# Altium footprint library SparkFun.PCBLIB: 674 footprints (part 22 of 44)
Each footprint in its own frame and in the unit in brackets; x right, y up, seen from the top. Pads: shape width x height; smd on the part's side, far side on the other; paste and mask are expansions set on the pad; w line width, h text height; cw(c..) or ccw(c..) is an arc to the next point about the centre after c.
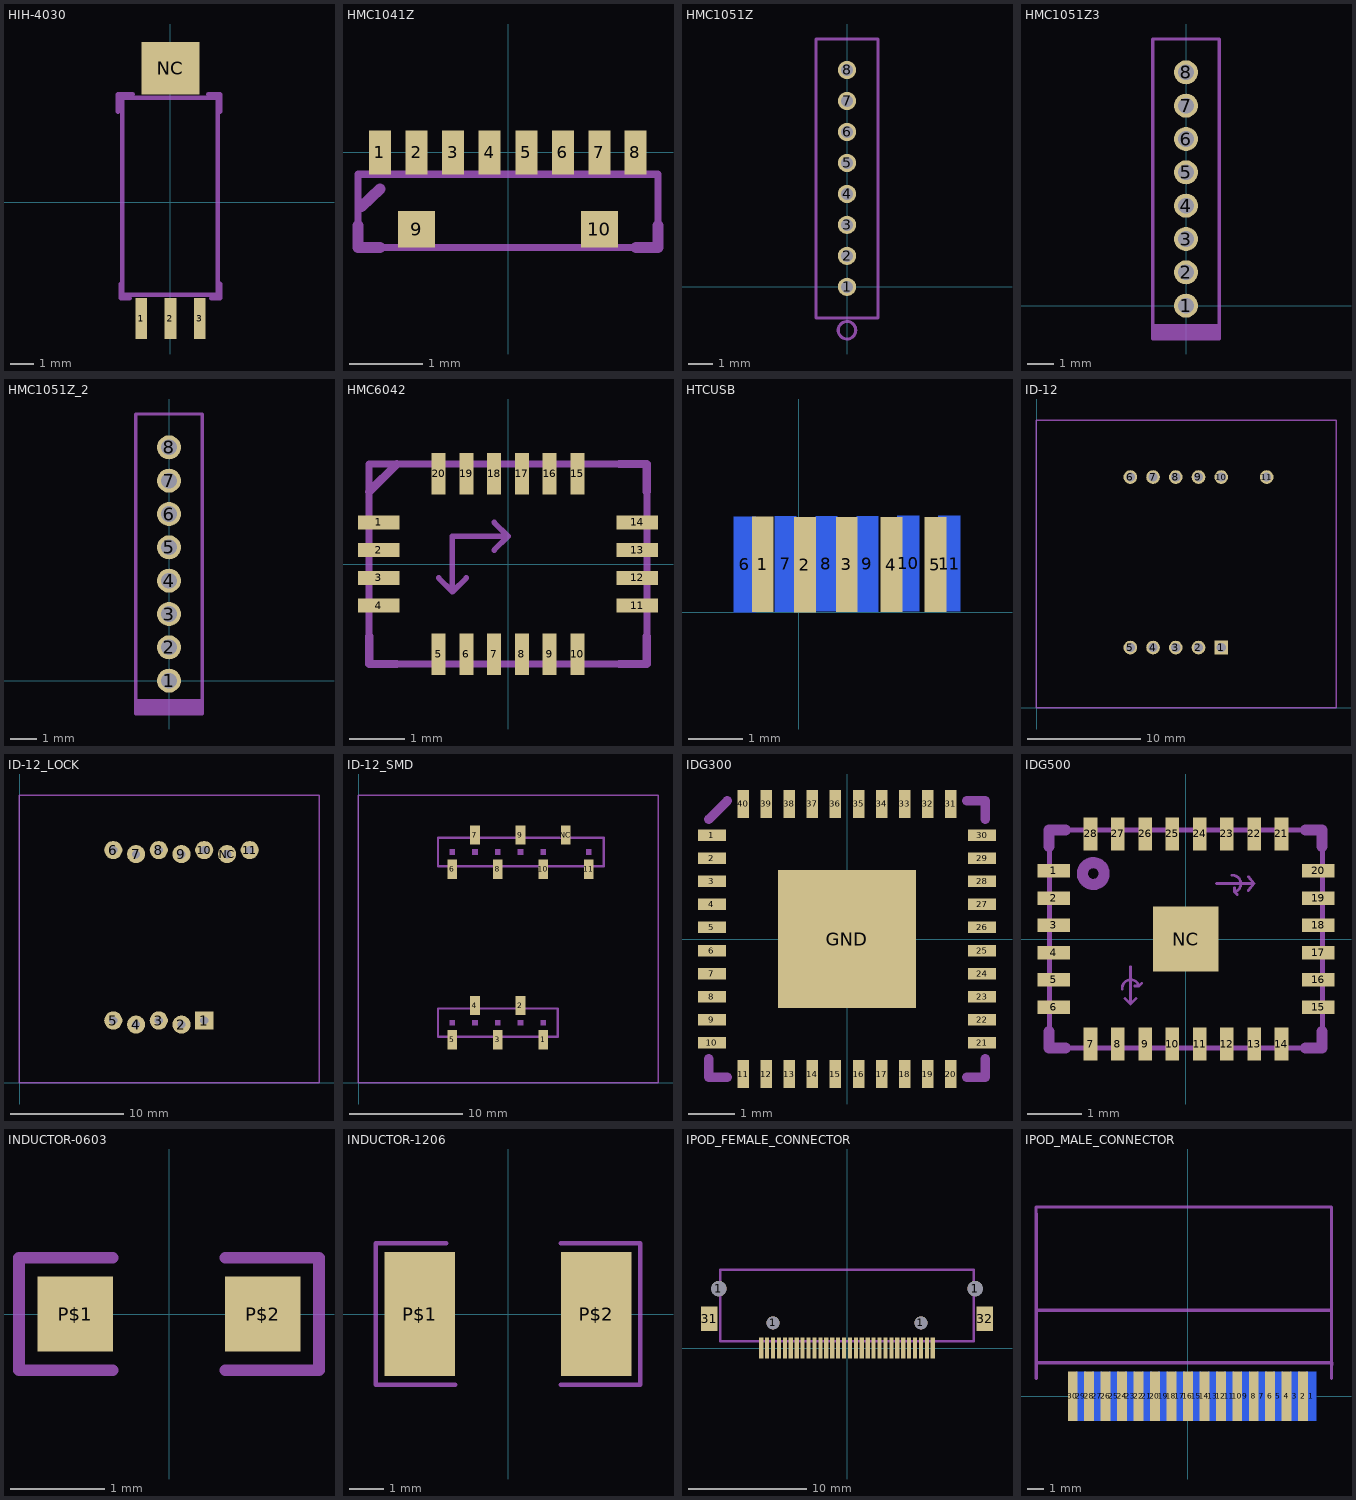
[diagram p21: the footprints below, top view; thin cyan lines are the x and y axes]

## HIH-4030 [mil]
pads (4):
  rect 20x70 smd: 1(-50,-200) 2(0,-200) 3(50,-200)
  rect 100x90 smd: NC(0,230)
Mechanical 2:
  lines w8: -90,155 -90,185 -65,185 ; -85,-140 -85,-165 -70,-165 ; 65,185 85,185 85,155 ; 70,-165 85,-165 85,-140
Mechanical 18:
  lines w8: -83,-159 81,-159 81,179 -83,179 -83,-159

## HMC1041Z [mil]
pads (10):
  rect 11.81x23.62 smd: 1(-68.9,0) 2(-49.21,0) 3(-29.53,0) 4(-9.84,0) 5(9.84,0) 6(29.53,0) 7(49.21,0) 8(68.5,0)
  rect 19.69x19.69 smd: 9(-49.21,-41.34) 10(49.21,-41.34)
Mechanical 2:
  lines w6: -80.71,-39.37 -80.71,-51.18 -68.9,-51.18 ; -78.74,-29.13 -68.9,-19.69 ; 68.9,-51.18 80.71,-51.18 80.71,-39.37
Mechanical 18:
  lines w3.94: -80.71,-51.18 80.71,-51.18 80.71,-11.81 -80.71,-11.81 -80.71,-51.18

## HMC1051Z [mil]
pads (8):
  round 29.54 hole 19.69: 1(0,0) 2(0,50) 3(0,100) 4(0,150) 5(0,200) 6(0,250) 7(0,300) 8(0,350)
Mechanical 2:
  circle w5: c0,-70 r14.14
  lines w5: -50,-50 -50,400 50,400 50,-50 -50,-50

## HMC1051Z3 [mil]
pads (8):
  round 36 hole 23.62: 1(0,0) 2(0,50) 3(0,100) 4(0,150) 5(0,200) 6(0,250) 7(0,300) 8(0,350)
Mechanical 2:
  lines w5: -50,-45 -50,-40 ; -50,-45 -50,-50 50,-50 50,-45 ; -50,-45 50,-45 ; -50,-40 50,-40 ; -50,-40 -50,-35 ; -50,-35 -50,-30 ; -50,-35 50,-35 ; -50,-30 -50,400 50,400 50,-30 ; -50,-30 50,-30 ; 50,-45 50,-40 ; 50,-40 50,-35 ; 50,-35 50,-30

## HMC1051Z_2 [mil]
pads (8):
  round 36 hole 23.62: 1(0,0) 2(0,50) 3(0,100) 4(0,150) 5(0,200) 6(0,250) 7(0,300) 8(0,350)
Mechanical 2:
  lines w5: -50,-45 -50,-40 ; -50,-45 -50,-50 50,-50 50,-45 ; -50,-45 50,-45 ; -50,-40 50,-40 ; -50,-40 -50,-35 ; -50,-35 -50,-30 ; -50,-35 50,-35 ; -50,-30 -50,400 50,400 50,-30 ; -50,-30 50,-30 ; 50,-45 50,-40 ; 50,-40 50,-35 ; 50,-35 50,-30

## HMC6042 [mil]
pads (20):
  rect 29.53x9.84 smd: 1(-91.54,29.53) 2(-91.54,9.84) 3(-91.54,-9.84) 4(-91.54,-29.53) 11(91.54,-29.53) 12(91.54,-9.84) 13(91.54,9.84) 14(91.54,29.53)
  rect 9.84x29.53 smd: 5(-49.21,-63.98) 6(-29.53,-63.98) 7(-9.84,-63.98) 8(9.84,-63.98) 9(29.53,-63.98) 10(49.21,-63.98) 15(49.21,63.98) 16(29.53,63.98) 17(9.84,63.98) 18(-9.84,63.98) 19(-29.53,63.98) 20(-49.21,63.98)
Mechanical 2:
  lines w6: -98.43,-51.18 -98.43,-70.87 -78.74,-70.87 ; -98.43,51.18 -78.74,70.87 ; 78.74,-70.87 98.43,-70.87 98.43,-51.18 ; 78.74,70.87 98.43,70.87 98.43,51.18
Mechanical 18:
  lines w3.94: -49.21,-9.84 -39.37,-19.69 ; -29.53,-9.84 -39.37,-19.69 ; -9.84,9.84 0,19.69 ; -9.84,29.53 0,19.69 ; -39.37,-19.69 -39.37,19.69 0,19.69
  lines w5: -98.43,-70.87 98.43,-70.87 98.43,70.87 -98.43,70.87 -98.43,-70.87

## HTCUSB [mil]
pads (11):
  rect 15.75x68.9 smd: 1(-26.03,34.45) 2(4.42,34.32) 3(34.61,34.41) 4(66.97,34.35) 5(98.76,34.35)
  rect 15.75x68.9 smd far side: 6(-39.1,34.45) 7(-9.57,34.84) 8(20,34.91) 9(49.59,34.85) 10(79.18,35.16) 11(108.77,35.03)

## ID-12 [mil]
pads (11):
  rect 47.25x47.25 hole 31.5: 1(639.96,209.45)
  round 47.25 hole 31.5: 2(561.22,209.45) 3(482.48,209.45) 4(403.74,209.45) 5(325,209.45) 6(325,800) 7(403.74,800) 8(482.48,800) 9(561.22,800) 10(639.96,800) 11(797.44,800)
Mechanical 18:
  lines w5: -1.77,0.79 1037.6,0.79 1037.6,996.85 -1.77,996.85 -1.77,0.79

## ID-12_LOCK [mil]
pads (12):
  rect 63x63 hole 29: 1(639.96,216.45)
  round 63 hole 29: 2(561.22,202.45) 3(482.48,216.45) 4(403.74,202.45) 5(325,216.45) 6(325,807) 7(403.74,793) 8(482.48,807) 9(561.22,793) 10(639.96,807) 11(797.44,807) NC(719.22,793)
Mechanical 18:
  region: 808,796 808,804 788,804 788,796
  region: 649,796 649,804 629,804 629,796
  region: 571,796 571,804 551,804 551,796
  region: 493,796 493,804 473,804 473,796
  region: 414,796 414,804 394,804 394,796
  region: 335,796 335,804 315,804 315,796
  region: 650,205 650,213 630,213 630,205
  region: 571,205 571,213 551,213 551,205
  region: 491,205 491,213 471,213 471,205
  region: 413,205 413,213 393,213 393,205
  region: 335,205 335,213 315,213 315,205
  lines w5: -1.77,0.79 1037.6,0.79 1037.6,996.85 -1.77,996.85 -1.77,0.79

## ID-12_SMD [mil]
pads (12):
  rect 33.46x66.93 smd: 1(639.7,150.02) 2(560.96,268.13) 3(482.22,150.02) 4(403.48,268.13) 5(324.74,150.02) 6(324.74,741.02) 7(403.48,859.13) 8(482.22,741.02) 9(560.96,859.13) 10(639.7,741.02) 11(797.18,741.02) NC(718.44,859.13)
Mechanical 18:
  rectangle: 472.48,790 492.48,810
  rectangle: 393.74,790 413.74,810
  rectangle: 315,790 335,810
  rectangle: 551.22,790 571.22,810
  rectangle: 629.96,790 649.96,810
  rectangle: 787.44,790 807.44,810
  rectangle: 472.48,199 492.48,219
  rectangle: 393.74,199 413.74,219
  rectangle: 315,199 335,219
  rectangle: 551.22,199 571.22,219
  rectangle: 629.96,199 649.96,219
  lines w5: -1.77,0.79 1037.6,0.79 1037.6,996.85 -1.77,996.85 -1.77,0.79
  lines w8: 275.53,159.86 275.53,258.28 ; 275.53,750.86 275.53,849.28 ; 276.03,159.86 690.11,159.86 690.11,258.28 276.03,258.28 ; 276.03,750.86 850.11,750.86 850.11,849.28 276.03,849.28

## IDG300 [mm]
pads (41):
  rect 0.6x0.25 smd paste-0.3 mask-0.3: 1(-2.925,2.25) 2(-2.925,1.75) 3(-2.925,1.25) 4(-2.925,0.75) 5(-2.925,0.25) 6(-2.925,-0.25) 7(-2.925,-0.75) 8(-2.925,-1.25) 9(-2.925,-1.75) 10(-2.925,-2.25) 21(2.925,-2.25) 22(2.925,-1.75) 23(2.925,-1.25) 24(2.925,-0.75) 25(2.925,-0.25) 26(2.925,0.25) 27(2.925,0.75) 28(2.925,1.25) 29(2.925,1.75) 30(2.925,2.25)
  rect 0.25x0.6 smd paste-0.3 mask-0.3: 11(-2.25,-2.925) 12(-1.75,-2.925) 13(-1.25,-2.925) 14(-0.75,-2.925) 15(-0.25,-2.925) 16(0.25,-2.925) 17(0.75,-2.925) 18(1.25,-2.925) 19(1.75,-2.925) 20(2.25,-2.925) 31(2.25,2.925) 32(1.75,2.925) 33(1.25,2.925) 34(0.75,2.925) 35(0.25,2.925) 36(-0.25,2.925) 37(-0.75,2.925) 38(-1.25,2.925) 39(-1.75,2.925) 40(-2.25,2.925)
  rect 3x3 smd paste-1.5 mask-1.5: GND(0,0)
Top Paste:
  rectangle: 2.65,0.15 3.1,0.35
  rectangle: 2.65,0.15 3.1,0.35
  rectangle: 2.65,0.15 3.1,0.35
  rectangle: 2.65,-0.35 3.1,-0.15
  rectangle: 2.65,-0.85 3.1,-0.65
  rectangle: 2.65,-1.35 3.1,-1.15
  rectangle: 2.65,-1.85 3.1,-1.65
  rectangle: 2.65,-2.35 3.1,-2.15
  rectangle: 2.65,0.65 3.1,0.85
  rectangle: 2.65,1.15 3.1,1.35
  rectangle: 2.65,1.65 3.1,1.85
  rectangle: 2.65,2.15 3.1,2.35
  region: -0.15,2.65 -0.15,3.1 -0.35,3.1 -0.35,2.65
  region: -0.15,2.65 -0.15,3.1 -0.35,3.1 -0.35,2.65
  region: -0.15,2.65 -0.15,3.1 -0.35,3.1 -0.35,2.65
  region: 0.35,2.65 0.35,3.1 0.15,3.1 0.15,2.65
  region: 0.85,2.65 0.85,3.1 0.65,3.1 0.65,2.65
  region: 1.35,2.65 1.35,3.1 1.15,3.1 1.15,2.65
  region: 1.85,2.65 1.85,3.1 1.65,3.1 1.65,2.65
  region: 2.35,2.65 2.35,3.1 2.15,3.1 2.15,2.65
  region: -0.65,2.65 -0.65,3.1 -0.85,3.1 -0.85,2.65
  region: -1.15,2.65 -1.15,3.1 -1.35,3.1 -1.35,2.65
  region: -1.65,2.65 -1.65,3.1 -1.85,3.1 -1.85,2.65
  region: -2.15,2.65 -2.15,3.1 -2.35,3.1 -2.35,2.65
  region: -2.65,-0.15 -3.1,-0.15 -3.1,-0.35 -2.65,-0.35
  region: -2.65,-0.15 -3.1,-0.15 -3.1,-0.35 -2.65,-0.35
  region: -2.65,-0.15 -3.1,-0.15 -3.1,-0.35 -2.65,-0.35
  region: -2.65,0.35 -3.1,0.35 -3.1,0.15 -2.65,0.15
  region: -2.65,0.85 -3.1,0.85 -3.1,0.65 -2.65,0.65
  region: -2.65,1.35 -3.1,1.35 -3.1,1.15 -2.65,1.15
  region: -2.65,1.85 -3.1,1.85 -3.1,1.65 -2.65,1.65
  region: -2.65,2.35 -3.1,2.35 -3.1,2.15 -2.65,2.15
  region: -2.65,-0.65 -3.1,-0.65 -3.1,-0.85 -2.65,-0.85
  region: -2.65,-1.15 -3.1,-1.15 -3.1,-1.35 -2.65,-1.35
  region: -2.65,-1.65 -3.1,-1.65 -3.1,-1.85 -2.65,-1.85
  region: -2.65,-2.15 -3.1,-2.15 -3.1,-2.35 -2.65,-2.35
  region: 0.15,-2.65 0.15,-3.1 0.35,-3.1 0.35,-2.65
  region: 0.15,-2.65 0.15,-3.1 0.35,-3.1 0.35,-2.65
  region: 0.15,-2.65 0.15,-3.1 0.35,-3.1 0.35,-2.65
  region: -0.35,-2.65 -0.35,-3.1 -0.15,-3.1 -0.15,-2.65
  region: -0.85,-2.65 -0.85,-3.1 -0.65,-3.1 -0.65,-2.65
  region: -1.35,-2.65 -1.35,-3.1 -1.15,-3.1 -1.15,-2.65
  region: -1.85,-2.65 -1.85,-3.1 -1.65,-3.1 -1.65,-2.65
  region: -2.35,-2.65 -2.35,-3.1 -2.15,-3.1 -2.15,-2.65
  region: 0.65,-2.65 0.65,-3.1 0.85,-3.1 0.85,-2.65
  region: 1.15,-2.65 1.15,-3.1 1.35,-3.1 1.35,-2.65
  region: 1.65,-2.65 1.65,-3.1 1.85,-3.1 1.85,-2.65
  region: 2.15,-2.65 2.15,-3.1 2.35,-3.1 2.35,-2.65
  rectangle: -0.6,-0.6 0.6,0.6
Top Solder:
  rectangle: -1.524,-1.524 1.524,1.524
  rectangle: -3.25,2.1 -2.6,2.4
  rectangle: -3.25,1.6 -2.6,1.9
  rectangle: -3.25,1.1 -2.6,1.4
  rectangle: -3.25,0.6 -2.6,0.9
  rectangle: -3.25,0.1 -2.6,0.4
  rectangle: -3.25,-0.4 -2.6,-0.1
  rectangle: -3.25,-0.9 -2.6,-0.6
  rectangle: -3.25,-1.4 -2.6,-1.1
  rectangle: -3.25,-1.9 -2.6,-1.6
  rectangle: -3.25,-2.4 -2.6,-2.1
  rectangle: -2.4,-3.25 -2.1,-2.6
  rectangle: -1.9,-3.25 -1.6,-2.6
  rectangle: -1.4,-3.25 -1.1,-2.6
  rectangle: -0.9,-3.25 -0.6,-2.6
  rectangle: -0.4,-3.25 -0.1,-2.6
  rectangle: 0.1,-3.25 0.4,-2.6
  rectangle: 0.6,-3.25 0.9,-2.6
  rectangle: 1.1,-3.25 1.4,-2.6
  rectangle: 1.6,-3.25 1.9,-2.6
  rectangle: 2.1,-3.25 2.4,-2.6
  rectangle: 2.6,-2.4 3.25,-2.1
  rectangle: 2.6,-1.9 3.25,-1.6
  rectangle: 2.6,-1.4 3.25,-1.1
  rectangle: 2.6,-0.9 3.25,-0.6
  rectangle: 2.6,-0.4 3.25,-0.1
  rectangle: 2.6,0.1 3.25,0.4
  rectangle: 2.6,0.6 3.25,0.9
  rectangle: 2.6,1.1 3.25,1.4
  rectangle: 2.6,1.6 3.25,1.9
  rectangle: 2.6,2.1 3.25,2.4
  rectangle: 2.1,2.6 2.4,3.25
  rectangle: 1.6,2.6 1.9,3.25
  rectangle: 1.1,2.6 1.4,3.25
  rectangle: 0.6,2.6 0.9,3.25
  rectangle: 0.1,2.6 0.4,3.25
  rectangle: -0.4,2.6 -0.1,3.25
  rectangle: -0.9,2.6 -0.6,3.25
  rectangle: -1.4,2.6 -1.1,3.25
  rectangle: -1.9,2.6 -1.6,3.25
  rectangle: -2.4,2.6 -2.1,3.25
Mechanical 2:
  lines w0.203: -2.997,-2.591 -2.997,-2.997 -2.591,-2.997 ; -2.997,2.591 -2.591,2.997 ; 2.591,-2.997 2.997,-2.997 2.997,-2.591 ; 2.591,2.997 2.997,2.997 2.997,2.591
Mechanical 18:
  lines w0.051: -1.168,-0.914 cw(c-1.014,-0.902) -0.864,-0.864 ; -1.118,-1.092 -1.016,-1.194 ; -1.016,-0.508 -1.016,-1.194 ; -0.94,-0.864 -0.864,-0.864 ; -0.914,-1.092 -1.016,-1.194 ; -0.813,-0.813 -0.864,-0.864 ; 0.559,1.016 1.245,1.016 ; 0.838,1.168 cw(c0.851,1.014) 0.889,0.864 ; 0.889,0.94 0.889,0.864 ; 0.94,0.813 0.889,0.864 ; 1.143,0.889 1.245,1.016 ; 1.143,1.143 1.245,1.016

## IDG500 [mil]
pads (29):
  rect 23.62x9.84 smd paste-11.81 mask-11.81: 1(-95.16,49.21) 2(-95.16,29.53) 3(-95.16,9.84) 4(-95.16,-9.84) 5(-95.16,-29.53) 6(-95.16,-49.21) 15(95.79,-49.21) 16(95.79,-29.53) 17(95.79,-9.84) 18(95.79,9.84) 19(95.79,29.53) 20(95.79,49.21)
  rect 9.84x23.62 smd paste-11.81 mask-11.81: 7(-68.58,-75.79) 8(-48.9,-75.79) 9(-29.21,-75.79) 10(-9.53,-75.79) 11(10.16,-75.79) 12(29.84,-75.79) 13(49.53,-75.79) 14(69.21,-75.79) 21(69.21,75.79) 22(49.53,75.79) 23(29.84,75.79) 24(10.16,75.79) 25(-9.53,75.79) 26(-29.21,75.79) 27(-48.9,75.79) 28(-68.58,75.79)
  rect 47.24x47.24 smd paste-23.62 mask-23.62: NC(0,0)
Top Paste:
  region: -25.59,64.96 -25.59,82.68 -33.47,82.68 -33.47,64.96
  region: -25.59,64.96 -25.59,82.68 -33.47,82.68 -33.47,64.96
  region: -25.59,64.96 -25.59,82.68 -33.47,82.68 -33.47,64.96
  region: -5.9,64.96 -5.9,82.68 -13.78,82.68 -13.78,64.96
  region: 13.78,64.96 13.78,82.68 5.9,82.68 5.9,64.96
  region: 33.47,64.96 33.47,82.68 25.59,82.68 25.59,64.96
  region: 53.15,64.96 53.15,82.68 45.27,82.68 45.27,64.96
  region: 72.84,64.96 72.84,82.68 64.96,82.68 64.96,64.96
  region: -45.27,64.96 -45.27,82.68 -53.15,82.68 -53.15,64.96
  region: -64.96,64.96 -64.96,82.68 -72.84,82.68 -72.84,64.96
  region: -84.65,-45.28 -102.36,-45.28 -102.36,-53.15 -84.65,-53.15
  region: -84.65,-45.28 -102.36,-45.28 -102.36,-53.15 -84.65,-53.15
  region: -84.65,-45.28 -102.36,-45.28 -102.36,-53.15 -84.65,-53.15
  region: -84.65,-25.59 -102.36,-25.59 -102.36,-33.46 -84.65,-33.46
  region: -84.65,-5.91 -102.36,-5.91 -102.36,-13.78 -84.65,-13.78
  region: -84.65,13.78 -102.36,13.78 -102.36,5.91 -84.65,5.91
  region: -84.65,33.46 -102.36,33.46 -102.36,25.59 -84.65,25.59
  region: -84.65,53.15 -102.36,53.15 -102.36,45.28 -84.65,45.28
  region: -72.84,-64.96 -72.84,-82.68 -64.96,-82.68 -64.96,-64.96
  region: -53.15,-64.96 -53.15,-82.68 -45.27,-82.68 -45.27,-64.96
  region: -33.47,-64.96 -33.47,-82.68 -25.59,-82.68 -25.59,-64.96
  region: -13.78,-64.96 -13.78,-82.68 -5.9,-82.68 -5.9,-64.96
  rectangle: 84.65,-33.46 102.36,-25.59
  rectangle: 84.65,-33.46 102.36,-25.59
  rectangle: 84.65,-33.46 102.36,-25.59
  rectangle: 84.65,-53.15 102.36,-45.28
  region: 64.96,-64.96 64.96,-82.68 72.84,-82.68 72.84,-64.96
  region: 45.27,-64.96 45.27,-82.68 53.15,-82.68 53.15,-64.96
  region: 25.59,-64.96 25.59,-82.68 33.47,-82.68 33.47,-64.96
  region: 5.9,-64.96 5.9,-82.68 13.78,-82.68 13.78,-64.96
  rectangle: 84.65,-13.78 102.36,-5.91
  rectangle: 84.65,5.91 102.36,13.78
  rectangle: 84.65,25.59 102.36,33.46
  rectangle: 84.65,45.28 102.36,53.15
  rectangle: -23.62,-23.62 23.62,23.62
Top Solder:
  rectangle: -107.95,43.31 -82.36,55.12
  rectangle: -107.95,23.62 -82.36,35.43
  rectangle: -107.95,3.94 -82.36,15.75
  rectangle: -107.95,-15.75 -82.36,-3.94
  rectangle: -107.95,-35.43 -82.36,-23.62
  rectangle: -107.95,-55.12 -82.36,-43.31
  rectangle: -74.49,-88.58 -62.68,-62.99
  rectangle: -54.8,-88.58 -42.99,-62.99
  region: -35.12,-62.99 -35.12,-88.58 -23.31,-88.58 -23.31,-62.99
  region: -15.43,-62.99 -15.43,-88.58 -3.62,-88.58 -3.62,-62.99
  region: 4.25,-62.99 4.25,-88.58 16.06,-88.58 16.06,-62.99
  region: 23.94,-62.99 23.94,-88.58 35.75,-88.58 35.75,-62.99
  region: 43.62,-62.99 43.62,-88.58 55.43,-88.58 55.43,-62.99
  region: 63.31,-62.99 63.31,-88.58 75.12,-88.58 75.12,-62.99
  rectangle: 82.99,-55.12 108.58,-43.31
  rectangle: 82.99,-35.43 108.58,-23.62
  rectangle: 82.99,-15.75 108.58,-3.94
  rectangle: 82.99,3.94 108.58,15.75
  region: 82.99,35.43 82.99,23.62 108.58,23.62 108.58,35.43
  region: 82.99,55.12 82.99,43.31 108.58,43.31 108.58,55.12
  rectangle: 63.31,62.99 75.12,88.58
  rectangle: 43.62,62.99 55.43,88.58
  rectangle: 23.94,62.99 35.75,88.58
  rectangle: 4.25,62.99 16.06,88.58
  rectangle: -15.43,62.99 -3.62,88.58
  rectangle: -35.12,62.99 -23.31,88.58
  rectangle: -54.8,62.99 -42.99,88.58
  rectangle: -74.49,62.99 -62.68,88.58
  rectangle: -23.62,-23.62 23.62,23.62
Mechanical 2:
  circle w8: c-66.61,47.24 r7.87
  lines w8: -98.43,-66.93 -98.43,-78.74 -86.61,-78.74 ; -98.43,66.93 -98.43,78.74 -86.61,78.74 ; 86.61,-78.74 98.43,-78.74 98.43,-66.93 ; 86.61,78.74 98.43,78.74 98.43,66.93
Mechanical 18:
  circle w3.54: c-66.61,47.24 r7.87
  lines w2: -45.69,-36 cw(c-39.61,-35.5) -33.69,-34 ; -43.69,-43 -39.69,-47 ; -39.69,-20 -39.69,-47 ; -36.69,-34 -33.69,-34 ; -35.69,-43 -39.69,-47 ; -31.69,-32 -33.69,-34 ; 22.32,40 49.32,40 ; 33.32,46 cw(c33.82,39.92) 35.32,34 ; 35.32,37 35.32,34 ; 37.32,32 35.32,34 ; 45.32,35 49.32,40 ; 45.32,45 49.32,40
  lines w3.54: -98.11,-78.74 98.74,-78.74 98.74,78.74 -98.11,78.74 -98.11,-78.74

## INDUCTOR-0603 [mil]
pads (2):
  rect 31.5x31.5 smd: P$1(-39.37,0) P$2(39.37,0)
Mechanical 18:
  lines w5: -23.62,-23.62 -62.99,-23.62 -62.99,23.62 -23.62,23.62 ; 23.62,-23.62 62.99,-23.62 62.99,23.62 23.62,23.62

## INDUCTOR-1206 [mil]
pads (2):
  rect 80x140 smd: P$1(-100,0) P$2(100,0)
Mechanical 2:
  lines w5: -70,80 -150,80 -150,-80 -60,-80 ; 60,-80 150,-80 150,80 60,80

## IPOD_FEMALE_CONNECTOR [mm]
pads (36):
  round 1.3 hole 1.3: 1(-10.825,5.025) 1(10.825,5.025)
  rect 0.35x1.75 smd: 1(-7.25,0) 2(-6.75,0) 3(-6.25,0) 4(-5.75,0) 5(-5.25,0) 6(-4.75,0) 7(-4.25,0) 8(-3.75,0) 9(-3.25,0) 10(-2.75,0) 11(-2.25,0) 12(-1.75,0) 13(-1.25,0) 14(-0.75,0) 15(-0.25,0) 16(0.25,0) 17(0.75,0) 18(1.25,0) 19(1.75,0) 20(2.25,0) 21(2.75,0) 22(3.25,0) 23(3.75,0) 24(4.25,0) 25(4.75,0) 26(5.25,0) 27(5.75,0) 28(6.25,0) 29(6.75,0) 30(7.25,0)
  round 1.1 hole 1.1: 1(-6.25,2.125) 1(6.25,2.125)
  rect 1.4x2.05 smd: 31(-11.65,2.475) 32(11.65,2.475)
Mechanical 18:
  lines w0.203: -10.7,0.575 10.7,0.575 10.7,6.625 -10.7,6.625 -10.7,0.575

## IPOD_MALE_CONNECTOR [mm]
pads (30):
  rect 0.6x3 smd far side paste-1.5: 1(7.5,0) 3(6.5,0) 5(5.5,0) 7(4.5,0) 9(3.5,0) 11(2.5,0) 13(1.5,0) 15(0.5,0) 17(-0.5,0) 19(-1.5,0) 21(-2.5,0) 23(-3.5,0) 25(-4.5,0) 27(-5.5,0) 29(-6.5,0)
  rect 0.6x3 smd paste-1.5: 2(7,0) 4(6,0) 6(5,0) 8(4,0) 10(3,0) 12(2,0) 14(1,0) 16(0,0) 18(-1,0) 20(-2,0) 22(-3,0) 24(-4,0) 26(-5,0) 28(-6,0) 30(-7,0)
Mechanical 18:
  lines w0.203: -9.232,5.224 8.727,5.224 8.727,4.883 ; -9.229,2.027 8.733,2.027 8.733,1.914 ; -9.229,11.078 -9.229,11.497 8.727,11.497 8.727,4.883 ; -9.225,1.1 -9.225,11.1 ; 8.725,1.1 8.725,4.1 ; 8.727,4.089 8.727,4.883